# Altium footprint library distance_sensor_v2.PcbLib: 32 footprints (part 1 of 2)
Each footprint in its own frame and in the unit in brackets; x right, y up, seen from the top. Pads: shape width x height; smd on the part's side, far side on the other; paste and mask are expansions set on the pad; w line width, h text height; cw(c..) or ccw(c..) is an arc to the next point about the centre after c.
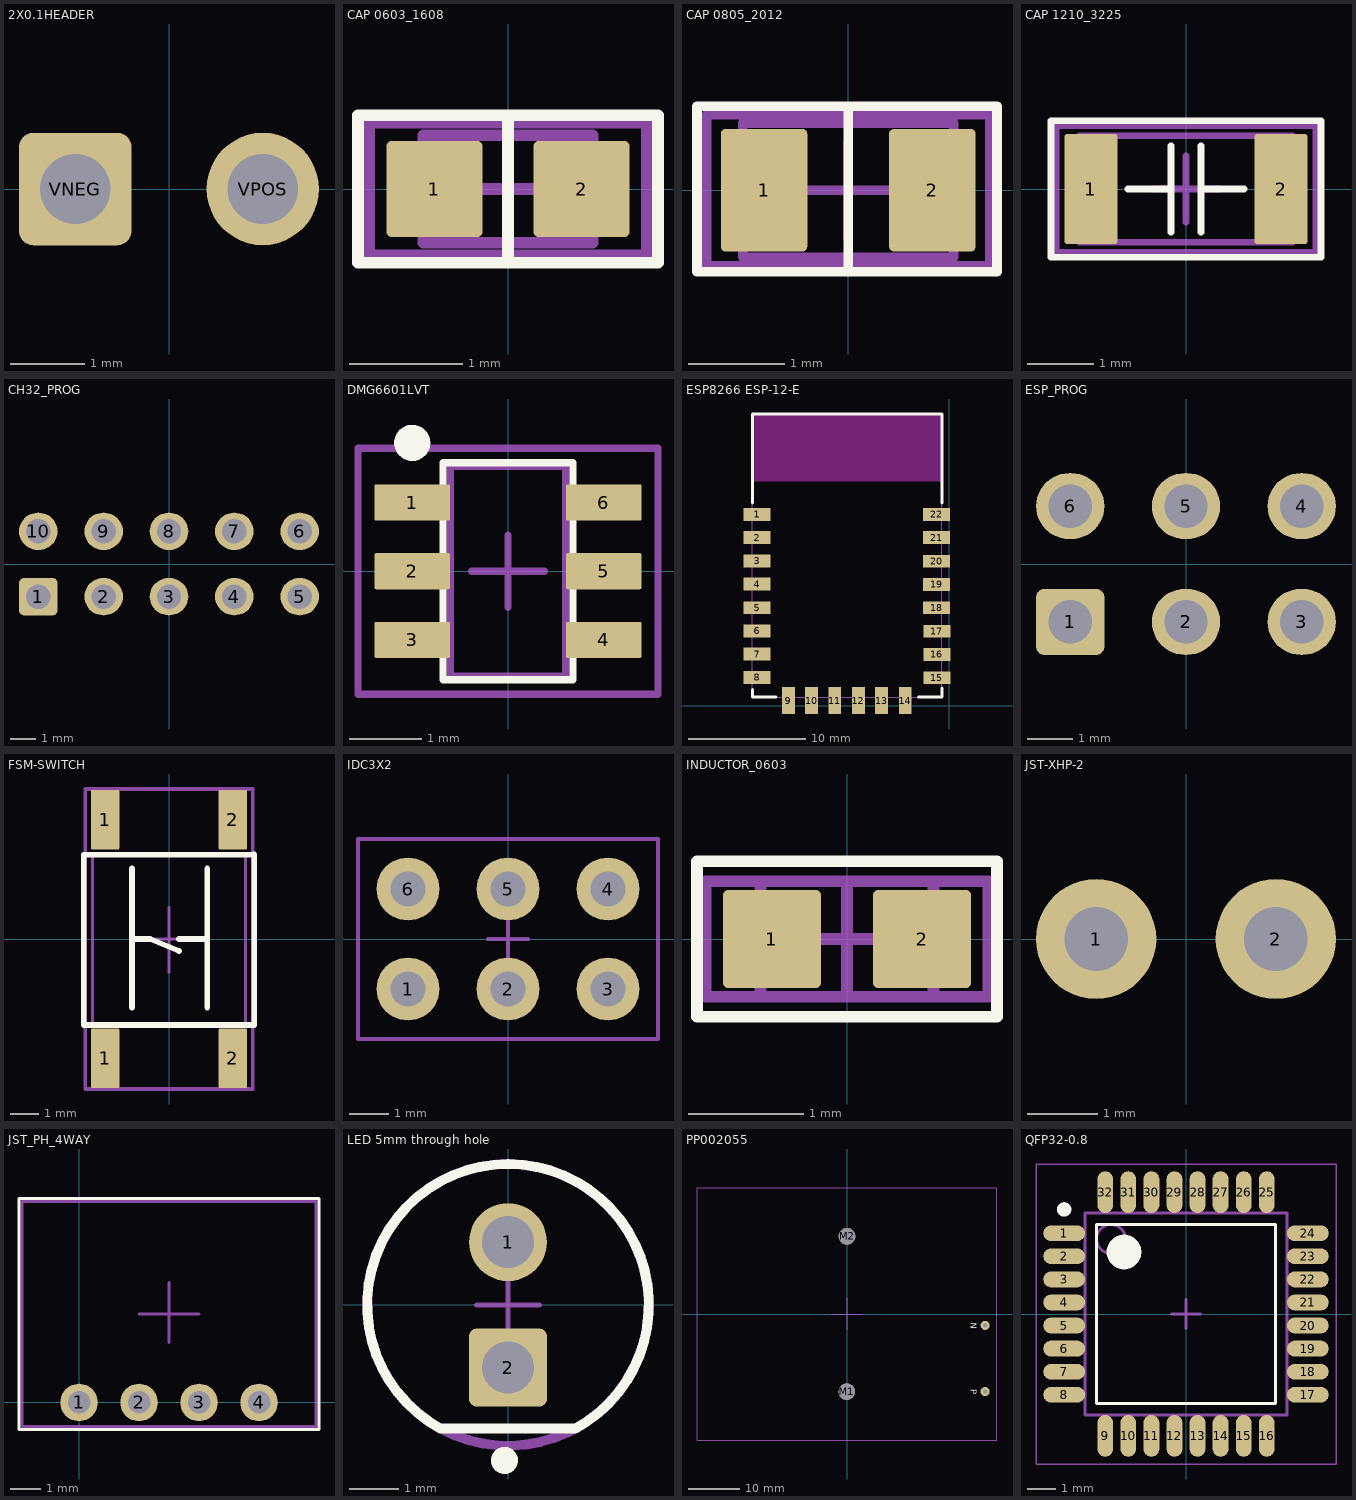
[diagram p0: the footprints below, top view; thin cyan lines are the x and y axes]

## 2X0.1HEADER [mil] "2 x 0.1 inch header"
pads (2):
  rrect25% 60x60 hole 37.4: VNEG(-50,0)
  round 60 hole 37.4: VPOS(50,0)

## CAP 0603_1608 [mm] "Chip Capacitor, 2-Leads, Body 1.60x0.80mm, IPC Medium Density"
height 0.89
pads (2):
  rrect10% 0.848x0.848 smd: 1(-0.65,0) 2(0.65,0)
Top Overlay:
  lines w0.102: 0,-0.65 0,0.65 ; -1.325,-0.65 -1.325,0.65 1.325,0.65 1.325,-0.65 -1.325,-0.65
Top Assembly:
  lines w0.102: -0.75,-0.475 -0.75,0.475 0.75,0.475 0.75,-0.475 -0.75,-0.475
Top Courtyard:
  lines w0.102: -0.475,0 0.475,0 ; 0,-0.475 0,0.475 ; -1.225,-0.584 -1.225,0.584 1.225,0.584 1.225,-0.584 -1.225,-0.584
3D body "0603 cap.STEP": height 0.82, standoff 0, extent -0.8,-0.412 0.8,0.412

## CAP 0805_2012 [mm] "Chip Capacitor, 2-Leads, Body 2.00x1.20mm, IPC Medium Density"
height 1.15
pads (2):
  rrect10% 0.9x1.275 smd: 1(-0.876,0) 2(0.876,0)
Top Overlay:
  lines w0.102: 0,-0.85 0,0.875 ; -1.575,-0.85 -1.575,0.875 1.55,0.875 1.55,-0.85 -1.575,-0.85
Top Assembly:
  lines w0.1: -1.1,-0.7 -1.1,0.7 1.1,0.7 1.1,-0.7 -1.1,-0.7
Top Courtyard:
  lines w0.1: -0.5,0 0.5,0 ; 0,-0.5 0,0.5
  lines w0.102: -1.473,-0.787 1.473,-0.787 1.473,0.787 -1.473,0.787 -1.473,-0.787
3D body "0805 cap.STEP": height 1.26, standoff -0.02, extent -1,-0.637 1,0.637

## CAP 1210_3225 [mm] "Chip Capacitor, 2-Leads, Body 3.20x1.60mm, IPC High Density"
height 1.2
pads (2):
  rrect10% 0.8x1.65 smd: 1(-1.425,0) 2(1.425,0)
Top Overlay:
  lines w0.102: -0.875,0 -0.225,0 ; -0.225,-0.65 -0.225,0.65 ; 0.225,-0.65 0.225,0.65 ; 0.225,0 0.875,0 ; -2.025,-1.025 -2.025,1.025 2.025,1.025 2.025,-1.025 -2.025,-1.025
Top Assembly:
  lines w0.102: -1.6,-0.8 -1.6,0.8 1.6,0.8 1.6,-0.8 -1.6,-0.8
Top Courtyard:
  lines w0.102: -0.5,0 0.5,0 ; 0,-0.5 0,0.5 ; -1.95,-0.95 -1.95,0.95 1.95,0.95 1.95,-0.95 -1.95,-0.95
3D body "CAPC3216X12L.step": height 1.2, standoff 0, extent -1.6,-0.8 1.6,0.8

## CH32_PROG [mm]
pads (10):
  rrect25% 1.5x1.45 hole 0.95: 1(-5.08,-1.27)
  oval 1.5x1.45 hole 0.95: 2(-2.54,-1.27) 3(0,-1.27) 4(2.54,-1.27) 5(5.08,-1.27) 6(5.08,1.27) 7(2.54,1.27) 8(0,1.27) 9(-2.54,1.27) 10(-5.08,1.27)

## DMG6601LVT [mm]
height 1
pads (6):
  rrect10% 1.05x0.5 smd: 1(-1.325,0.95) 2(-1.325,0) 3(-1.325,-0.95) 4(1.325,-0.95) 5(1.325,0) 6(1.325,0.95)
Top Overlay:
  circle w0.25: c-1.325,1.775 r0.125
  lines w0.102: -0.9,-1.5 -0.9,1.5 0.9,1.5 0.9,-1.5 -0.9,-1.5
Top Assembly:
  lines w0.102: -0.8,-1.45 0.8,-1.45 0.8,1.45 -0.8,1.45 -0.8,-1.45
Top Courtyard:
  lines w0.1: -0.5,0 0.5,0 ; 0,-0.5 0,0.5
  lines w0.102: -2.075,-1.7 2.075,-1.7 2.075,1.7 -2.075,1.7 -2.075,-1.7
3D body "DMG6601LVT.step": height 1, standoff 0, extent -1.4,-1.45 1.4,1.45

## ESP8266 ESP-12-E [mm] "ESP8266 ESP-12-E"
pads (22):
  rrect1% 2.3x1.1 smd: 1(-16.486,16.408) 2(-16.486,14.427) 3(-16.486,12.421) 4(-16.486,10.439) 5(-16.486,8.407) 6(-16.486,6.426) 7(-16.486,4.445) 8(-16.486,2.438) 15(-1.065,2.413) 16(-1.065,4.42) 17(-1.065,6.401) 18(-1.091,8.407) 19(-1.091,10.414) 20(-1.091,12.395) 21(-1.091,14.427) 22(-1.091,16.408)
  rrect1% 1.1x2.3 smd: 9(-13.792,0.456) 10(-11.811,0.456) 11(-9.83,0.456) 12(-7.798,0.456) 13(-5.817,0.456) 14(-3.785,0.456)
Top Overlay:
  lines w0.254: -16.891,1.397 -16.891,0.762 -14.859,0.762 ; -16.891,17.399 -16.891,25.019 -0.635,25.019 -0.635,17.399 ; -2.667,0.762 -0.635,0.762 -0.635,1.524
Keep-Out Layer:
  rectangle: -16.891,19.252 -0.583,25.019
Top Assembly:
  lines w0.102: -16.891,0.762 -0.635,0.762 -0.635,25.019 -16.891,25.019 -16.891,0.762
Top Courtyard:
  lines w0.102: -16.891,0.762 -16.891,25.019 -0.635,25.019 -0.635,0.762 -16.891,0.762
3D body "ESP-12F.STEP": height 3.17, standoff 0, extent -16.788,0.94 -0.788,24.94

## ESP_PROG [mm]
pads (6):
  rrect25% 1.5x1.45 hole 0.95: 1(-2.54,-1.27)
  oval 1.5x1.45 hole 0.95: 2(0,-1.27) 3(2.54,-1.27) 4(2.54,1.27) 5(0,1.27) 6(-2.54,1.27)

## FSM-SWITCH [mm]
pads (4):
  rrect10% 1x2.1 smd: 1(-2.25,-4.2) 1(-2.25,4.2) 2(2.25,-4.2) 2(2.25,4.2)
Top Overlay:
  lines w0.2: 3,-3.028 -3,-3.028 -3,2.972 3,2.972
  lines w0.203: -1.3,-2.416 -1.3,2.487 ; -1.3,0 -0.66,0 0.353,-0.425 ; 0.353,0 1.35,0 ; 1.35,-2.416 1.35,2.487 ; 3,-3.028 3,2.972
Top Assembly:
  lines w0.1: -2.7,-3.028 2.7,-3.028 2.7,2.972 -2.7,2.972 -2.7,-3.028
Top Courtyard:
  lines w0.102: -1.115,0 0,0 ; 0,-1.171 0,0 ; 0,-0.028 0,1.115 ; 1.013,0 0,0
  lines w0.127: -2.946,-5.283 2.946,-5.283 2.946,5.283 -2.946,5.283 -2.946,-5.283
3D body "switch.stp.step": height 5.07, standoff -0.01, extent -3,-5 3,5

## IDC3X2 [mm]
pads (6):
  round 1.6 hole 0.9: 1(-2.54,-1.27) 2(0,-1.27) 3(2.54,-1.27) 4(2.54,1.27) 5(0,1.27) 6(-2.54,1.27)
Top Assembly:
  lines w0.102: -3.81,-2.54 3.81,-2.54 3.81,2.54 -3.81,2.54 -3.81,-2.54
Top Courtyard:
  lines w0.102: -0.508,0 0.508,0 ; 0,-0.508 0,0.508 ; -3.81,-2.54 3.81,-2.54 3.81,2.54 -3.81,2.54 -3.81,-2.54
3D body "User Library-IDC6.step": height 8, standoff -3, extent -3.81,-2.54 3.81,2.54

## INDUCTOR_0603 [mm]
height 1
pads (2):
  rrect10% 0.848x0.848 smd: 1(-0.65,0) 2(0.65,0)
Top Overlay:
  lines w0.102: -1.3,-0.675 1.3,-0.675 1.3,0.675 -1.3,0.675 -1.3,-0.675
Top Assembly:
  lines w0.102: -0.75,-0.5 0.75,-0.5 0.75,0.5 -0.75,0.5 -0.75,-0.5
Top Courtyard:
  lines w0.102: -0.5,0 0.5,0 ; 0,-0.5 0,0.5 ; -1.225,-0.5 1.225,-0.5 1.225,0.5 -1.225,0.5 -1.225,-0.5
3D body "L_0603.stp": height 0.81, standoff 0.01, extent -0.8,-0.4 0.8,0.4

## JST-XHP-2 [mm]
pads (2):
  round 1.7 hole 0.9: 1(-1.27,0) 2(1.27,0)
3D body "JST - XH - Thru (V) - 2Pin - 2.54mm.stp": height 7.21, standoff -3, extent -3.607,-3.353 3.607,2.489

## JST_PH_4WAY [mm]
pads (4):
  round 1.25 hole 0.75: 1(0,0) 2(2,0) 3(4,0) 4(6,0)
Top Overlay:
  lines w0.102: -2,-0.9 -2,6.8 8,6.8 8,-0.9 -2,-0.9
Top Assembly:
  lines w0.102: -1.9,-0.8 -1.9,6.7 7.9,6.7 7.9,-0.8 -1.9,-0.8
Top Courtyard:
  lines w0.102: 2,2.95 4,2.95 ; 3,2 3,4 ; -1.9,-0.8 -1.9,6.7 7.9,6.7 7.9,-0.8 -1.9,-0.8
3D body "User Library-PCB HEADER (JST SxB-PH-K-S (RIGHT ANGLE)).step": height 0.4, standoff -6.4, extent -1.95,-0.85 7.95,6.75

## LED 5mm through hole [mm] "5MM through hole LED"
pads (2):
  round 1.58 hole 1.05: 1(0,1.27)
  rrect20% 1.58x1.58 hole 1.05: 2(0,-1.27)
Top Overlay:
  circle w0.4: c-0.071,-3.147 r0.072
  lines w0.2: 1.36,-2.501 -1.366,-2.501 cw(c0,0) 1.362,-2.504
Top Assembly:
  circle w0.2: c0,0 r2.85
Top Courtyard:
  circle w0.2: c0,0 r2.85
  lines w0.102: -0.635,0 0.635,0 ; 0,-0.635 0,0.635
3D body "LED 5mm.step": height 13.8, standoff 1.31, extent -2.998,-2.5 2.998,3

## PP002055 [mm] "3 x AA Battery Holder"
pads (4):
  round 3.2 hole 3.2 unplated: M1(-0.025,-15.025) M2(0,15)
  round 1.75 hole 0.9: VNEG(26.7,-2.2) VPOS(26.7,-15)
Top Overlay:
  text "N" at 23.533,-1.675 h2
  text "P" at 23.554,-14.52 h2
Top Assembly:
  lines w0.102: -3,0 3,0 ; 0,-3 0,3 ; -29,-24.4 -29,24.4 29,24.4 29,-24.4 -29,-24.4
Top Courtyard:
  lines w0.102: -29,-24.4 -29,24.4 29,24.4 29,-24.4 -29,-24.4
3D body "battery_holder_3xAA.STEP": height 17, standoff -3.2, extent -29,-24 29,24

## QFP32-0.8 [mm] "TQFP, 32-Leads, Body 7.00x7.00mm, Pitch 0.80mm, IPC Medium Density"
height 1.6
pads (32):
  oval 1.45x0.55 smd: 1(-4.225,2.8) 2(-4.225,2) 3(-4.225,1.2) 4(-4.225,0.4) 5(-4.225,-0.4) 6(-4.225,-1.2) 7(-4.225,-2) 8(-4.225,-2.8) 17(4.225,-2.8) 18(4.225,-2) 19(4.225,-1.2) 20(4.225,-0.4) 21(4.225,0.4) 22(4.225,1.2) 23(4.225,2) 24(4.225,2.8)
  oval 0.55x1.45 smd: 9(-2.8,-4.225) 10(-2,-4.225) 11(-1.2,-4.225) 12(-0.4,-4.225) 13(0.4,-4.225) 14(1.2,-4.225) 15(2,-4.225) 16(2.8,-4.225) 25(2.8,4.225) 26(2,4.225) 27(1.2,4.225) 28(0.4,4.225) 29(-0.4,4.225) 30(-1.2,4.225) 31(-2,4.225) 32(-2.8,4.225)
Top Overlay:
  circle w0.6: c-2.149,2.149 r0.3
  circle w0.25: c-4.225,3.625 r0.125
  lines w0.102: -3.1,-3.1 3.1,-3.1 3.1,3.1 -3.1,3.1 -3.1,-3.1
Top Assembly:
  circle w0.1: c-2.6,2.6 r0.5
  lines w0.1: -3.5,-3.5 3.5,-3.5 3.5,3.5 -3.5,3.5 -3.5,-3.5
Top Courtyard:
  lines w0.05: -5.2,-5.2 5.2,-5.2 5.2,5.2 -5.2,5.2 -5.2,-5.2
  lines w0.1: -0.5,0 0.5,0 ; 0,-0.5 0,0.5
3D body "QFP32-0.8.step": height 1.6, standoff 0, extent -4.5,-4.5 4.5,4.5